# Altium footprint library Binh.PcbLib: 863 footprints (part 14 of 54)
Each footprint in its own frame and in the unit in brackets; x right, y up, seen from the top. Pads: shape width x height; smd on the part's side, far side on the other; paste and mask are expansions set on the pad; w line width, h text height; cw(c..) or ccw(c..) is an arc to the next point about the centre after c.
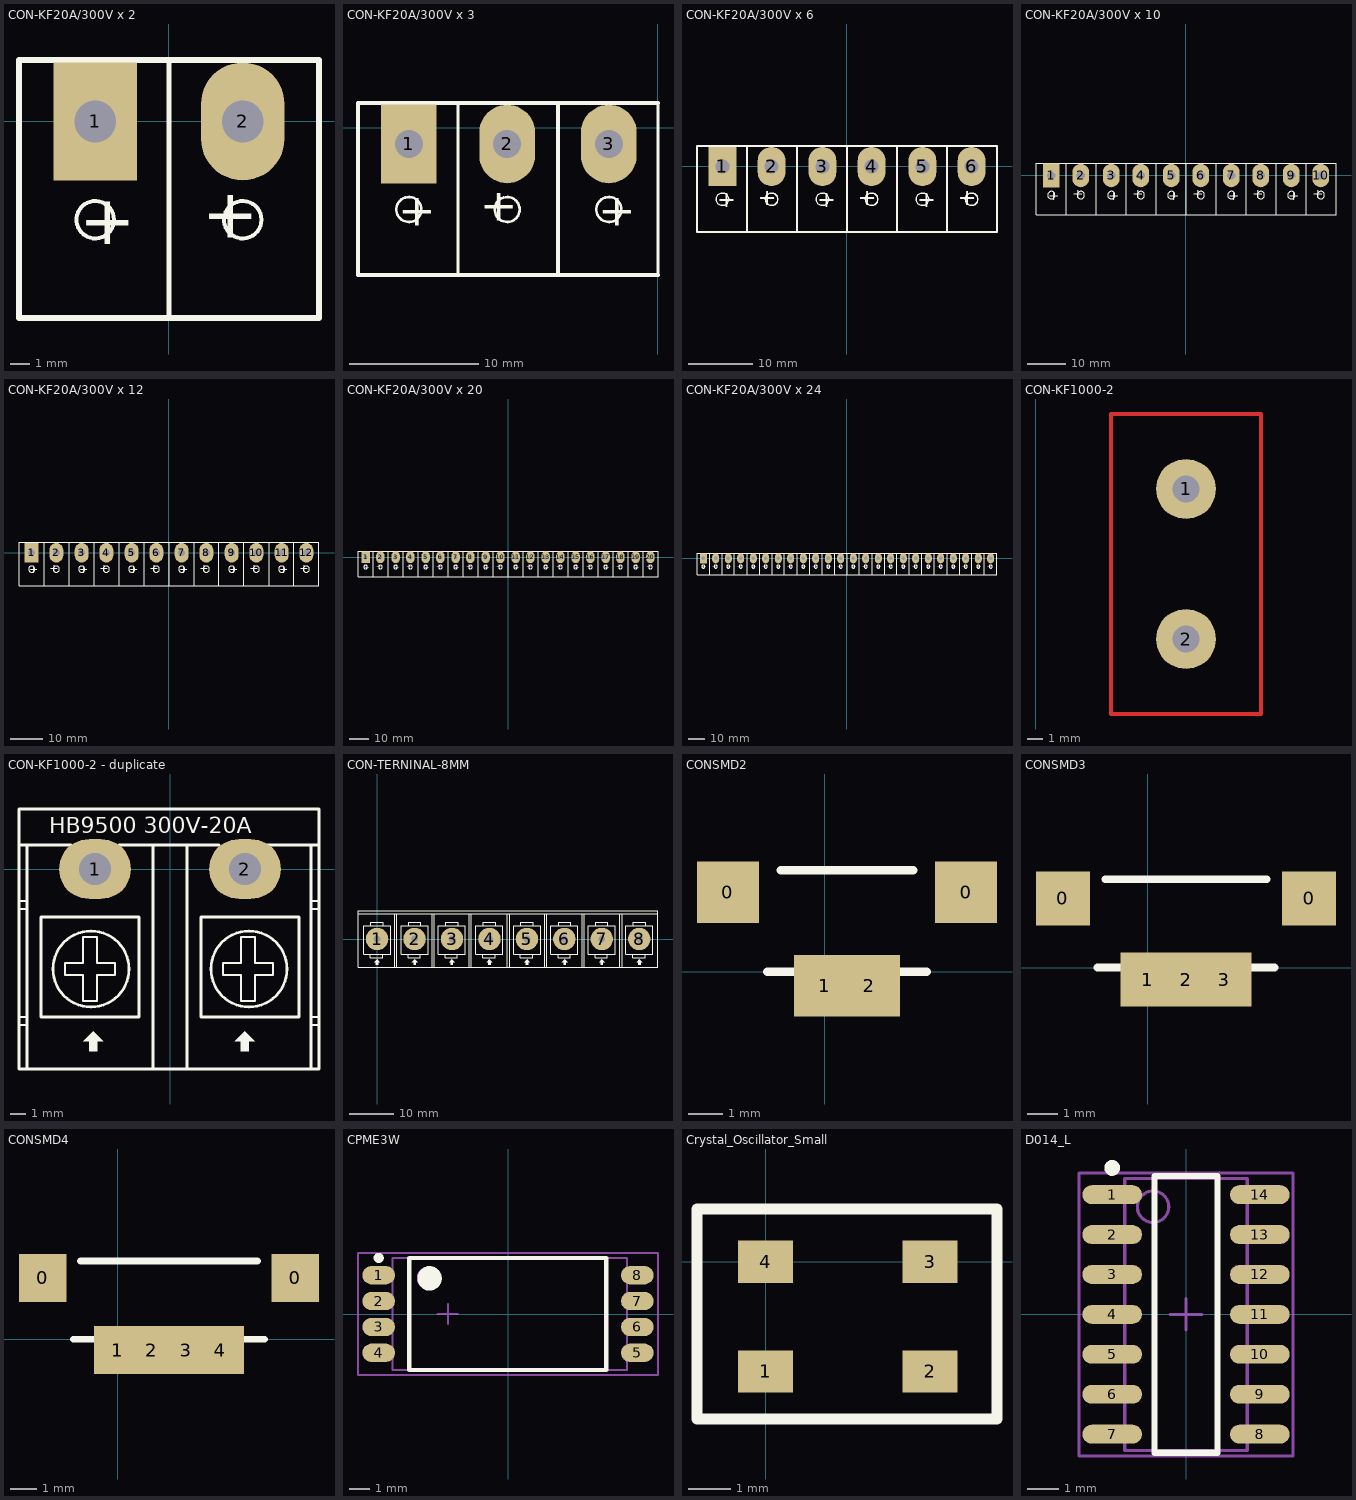
[diagram p13: the footprints below, top view; thin cyan lines are the x and y axes]

## CON-KF20A/300V x 2 [mil] "Jac nguon 220V 20A XANH"
pads (2):
  rect 170x240 hole 85: 1(-150,0)
  oval 170x240 hole 85: 2(150,0)
Top Overlay:
  circle w8: c-150,-200 r38.08
  circle w8: c150,-200 r38.08
  lines w10: 0,-400 0,125
  lines w11.81: 305.12,-400 305.12,125 ; 305.12,-400 305.12,125 ; 305.12,-400 -305.12,-400 -305.12,125 305.12,125
  text "+" at -183,-250 h100
  text "+" at 183,-150 h100

## CON-KF20A/300V x 3 [mil] "Jac nguon 220V 20A XANH"
height 500
pads (3):
  rect 170x240 hole 85: 1(-760.24,-50)
  oval 170x240 hole 85: 2(-460.24,-50) 3(-150,-50)
Top Overlay:
  circle w8: c-460.24,-250 r38.08
  circle w8: c-760.24,-250 r38.08
  circle w8: c-150,-250 r38.08
  lines w10: -610.24,-450 -610.24,75 ; 0,-450 0,75
  lines w11.81: 0,-450 -305.12,-450 ; 0,75 -915.35,75 -915.35,-450 -305.12,-450 ; -305.12,-450 -305.12,75 -305.12,-450
  text "+" at -427.24,-200 h100
  text "+" at -793.24,-300 h100
  text "+" at -183,-300 h100

## CON-KF20A/300V x 6 [mil] "Jac nguon 220V 20A XANH"
height 216.54
pads (6):
  rect 170x240 hole 85: 1(-760.24,0)
  oval 170x240 hole 85: 2(-460.24,0) 3(-150,0) 4(150,0) 5(460.24,0) 6(760.24,0)
Top Overlay:
  circle w8: c-460.24,-200 r38.08
  circle w8: c-760.24,-200 r38.08
  circle w8: c-150,-200 r38.08
  circle w8: c150,-200 r38.08
  circle w8: c760.24,-200 r38.08
  circle w8: c460.24,-200 r38.08
  lines w10: -610.24,-400 -610.24,125 ; 0,-400 0,125 ; 610.24,-400 610.24,125
  lines w11.81: -305.12,-400 -915.35,-400 -915.35,125 -305.12,125 ; -305.12,-400 -305.12,125 ; -305.12,-400 -305.12,125 ; -305.12,-400 305.12,-400 ; -305.12,125 305.12,125 ; 305.12,-400 305.12,125 ; 305.12,-400 915.35,-400 ; 305.12,-400 305.12,125 ; 305.12,125 915.35,125 ; 915.35,-400 915.35,125 ; 915.35,-400 915.35,125
  text "+" at -427.24,-150 h100
  text "+" at -793.24,-250 h100
  text "+" at -183,-250 h100
  text "+" at 183,-150 h100
  text "+" at 793.24,-150 h100
  text "+" at 427.24,-250 h100

## CON-KF20A/300V x 10 [mil] "Jac nguon 220V 20A XANH"
height 216.54
pads (10):
  rect 170x240 hole 85: 1(-1370.47,0)
  oval 170x240 hole 85: 2(-1070.47,0) 3(-760.24,0) 4(-460.24,0) 5(-150,0) 6(150,0) 7(460.24,0) 8(760.24,0) 9(1070.47,0) 10(1370.47,0)
Top Overlay:
  circle w8: c-1070.47,-200 r38.08
  circle w8: c-1370.47,-200 r38.08
  circle w8: c-760.24,-200 r38.08
  circle w8: c-460.24,-200 r38.08
  circle w8: c150,-200 r38.08
  circle w8: c-150,-200 r38.08
  circle w8: c760.24,-200 r38.08
  circle w8: c460.24,-200 r38.08
  circle w8: c1370.47,-200 r38.08
  circle w8: c1070.47,-200 r38.08
  lines w10: -1220.47,-400 -1220.47,125 ; -610.24,-400 -610.24,125 ; 0,-400 0,125 ; 610.24,-400 610.24,125 ; 1220.47,-400 1220.47,125
  lines w11.81: -915.35,-400 -1525.59,-400 -1525.59,125 -915.35,125 ; -915.35,-400 -915.35,125 ; -915.35,-400 -915.35,125 ; -915.35,-400 -305.12,-400 ; -915.35,125 -305.12,125 ; -305.12,-400 -305.12,125 ; -305.12,-400 305.12,-400 ; -305.12,-400 -305.12,125 ; -305.12,125 305.12,125 ; 305.12,-400 305.12,125 ; 305.12,-400 915.35,-400 ; 305.12,-400 305.12,125 ; 305.12,125 915.35,125 ; 915.35,-400 915.35,125 ; 915.35,-400 1525.59,-400 ; 915.35,-400 915.35,125 ; 915.35,125 1525.59,125 ; 1525.59,-400 1525.59,125 ; 1525.59,-400 1525.59,125
  text "+" at -1037.47,-150 h100
  text "+" at -1403.47,-250 h100
  text "+" at -793.24,-250 h100
  text "+" at -427.24,-150 h100
  text "+" at 183,-150 h100
  text "+" at -183,-250 h100
  text "+" at 793.24,-150 h100
  text "+" at 427.24,-250 h100
  text "+" at 1403.47,-150 h100
  text "+" at 1037.47,-250 h100

## CON-KF20A/300V x 12 [mil] "Jac nguon 220V 20A XANH"
height 216.54
pads (12):
  rect 170x240 hole 85: 1(-1675.59,0)
  oval 170x240 hole 85: 2(-1375.59,0) 3(-1065.35,0) 4(-765.35,0) 5(-455.12,0) 6(-155.12,0) 7(155.12,0) 8(455.12,0) 9(765.35,0) 10(1065.35,0) 11(1375.59,0) 12(1675.59,0)
Top Overlay:
  circle w8: c-1375.59,-200 r38.08
  circle w8: c-1675.59,-200 r38.08
  circle w8: c-1065.35,-200 r38.08
  circle w8: c-765.35,-200 r38.08
  circle w8: c-155.12,-200 r38.08
  circle w8: c-455.12,-200 r38.08
  circle w8: c455.12,-200 r38.08
  circle w8: c155.12,-200 r38.08
  circle w8: c1065.35,-200 r38.08
  circle w8: c765.35,-200 r38.08
  circle w8: c1675.59,-200 r38.08
  circle w8: c1375.59,-200 r38.08
  lines w10: -1525.59,-400 -1525.59,125 ; -915.35,-400 -915.35,125 ; -305.12,-400 -305.12,125 ; 305.12,-400 305.12,125 ; 915.35,-400 915.35,125 ; 1525.59,-400 1525.59,125
  lines w11.81: -1220.47,-400 -1830.71,-400 -1830.71,125 -1220.47,125 ; -1220.47,-400 -1220.47,125 ; -1220.47,-400 -1220.47,125 ; -1220.47,-400 -610.24,-400 ; -1220.47,125 -610.24,125 ; -610.24,-400 -610.24,125 ; -610.24,-400 0,-400 ; -610.24,-400 -610.24,125 ; -610.24,125 0,125 ; 0,-400 0,125 ; 0,-400 610.24,-400 ; 0,-400 0,125 ; 0,125 610.24,125 ; 610.24,-400 610.24,125 ; 610.24,-400 1220.47,-400 ; 610.24,-400 610.24,125 ; 610.24,125 1220.47,125 ; 1220.47,-400 1220.47,125 ; 1220.47,-400 1830.71,-400 ; 1220.47,-400 1220.47,125 ; 1220.47,125 1830.71,125 ; 1830.71,-400 1830.71,125 ; 1830.71,-400 1830.71,125
  text "+" at -1342.59,-150 h100
  text "+" at -1708.59,-250 h100
  text "+" at -1098.35,-250 h100
  text "+" at -732.35,-150 h100
  text "+" at -122.12,-150 h100
  text "+" at -488.12,-250 h100
  text "+" at 488.12,-150 h100
  text "+" at 122.12,-250 h100
  text "+" at 1098.35,-150 h100
  text "+" at 732.35,-250 h100
  text "+" at 1708.59,-150 h100
  text "+" at 1342.59,-250 h100

## CON-KF20A/300V x 20 [mil] "Jac nguon 220V 20A XANH"
height 216.54
pads (20):
  rect 170x240 hole 85: 1(-2896.06,0)
  oval 170x240 hole 85: 2(-2596.06,0) 3(-2285.83,0) 4(-1985.83,0) 5(-1675.59,0) 6(-1375.59,0) 7(-1065.35,0) 8(-765.35,0) 9(-455.12,0) 10(-155.12,0) 11(155.12,0) 12(455.12,0) 13(765.35,0) 14(1065.35,0) 15(1375.59,0) 16(1675.59,0) 17(1985.83,0) 18(2285.83,0) 19(2596.06,0) 20(2896.06,0)
Top Overlay:
  circle w8: c2596.06,-200 r38.08
  circle w8: c2896.06,-200 r38.08
  circle w8: c1985.83,-200 r38.08
  circle w8: c2285.83,-200 r38.08
  circle w8: c1375.59,-200 r38.08
  circle w8: c1675.59,-200 r38.08
  circle w8: c765.35,-200 r38.08
  circle w8: c1065.35,-200 r38.08
  circle w8: c155.12,-200 r38.08
  circle w8: c455.12,-200 r38.08
  circle w8: c-455.12,-200 r38.08
  circle w8: c-155.12,-200 r38.08
  circle w8: c-1065.35,-200 r38.08
  circle w8: c-765.35,-200 r38.08
  circle w8: c-1675.59,-200 r38.08
  circle w8: c-1375.59,-200 r38.08
  circle w8: c-1985.83,-200 r38.08
  circle w8: c-2285.83,-200 r38.08
  circle w8: c-2896.06,-200 r38.08
  circle w8: c-2596.06,-200 r38.08
  lines w10: -2746.06,-400 -2746.06,125 ; -2135.83,-400 -2135.83,125 ; -1525.59,-400 -1525.59,125 ; -915.35,-400 -915.35,125 ; -305.12,-400 -305.12,125 ; 305.12,-400 305.12,125 ; 915.35,-400 915.35,125 ; 1525.59,-400 1525.59,125 ; 2135.83,-400 2135.83,125 ; 2746.06,-400 2746.06,125
  lines w11.81: -2440.94,-400 -1830.71,-400 ; -2440.94,-400 -2440.94,125 ; -2440.94,-400 -2440.94,125 ; -2440.94,-400 -3051.18,-400 -3051.18,125 -2440.94,125 ; -2440.94,125 -1830.71,125 ; -1830.71,-400 -1830.71,125 ; -1830.71,-400 -1220.47,-400 ; -1830.71,-400 -1830.71,125 ; -1830.71,125 -1220.47,125 ; -1220.47,-400 -1220.47,125 ; -1220.47,-400 -610.24,-400 ; -1220.47,-400 -1220.47,125 ; -1220.47,125 -610.24,125 ; -610.24,-400 -610.24,125 ; -610.24,-400 0,-400 ; -610.24,-400 -610.24,125 ; -610.24,125 0,125 ; 0,-400 0,125 ; 0,-400 610.24,-400 ; 0,-400 0,125 ; 0,125 610.24,125 ; 610.24,-400 610.24,125 ; 610.24,-400 1220.47,-400 ; 610.24,-400 610.24,125 ; 610.24,125 1220.47,125 ; 1220.47,-400 1220.47,125 ; 1220.47,-400 1830.71,-400 ; 1220.47,-400 1220.47,125 ; 1220.47,125 1830.71,125 ; 1830.71,-400 1830.71,125 ; 1830.71,-400 2440.94,-400 ; 1830.71,-400 1830.71,125 ; 1830.71,125 2440.94,125 ; 2440.94,-400 2440.94,125 ; 2440.94,-400 3051.18,-400 3051.18,125 2440.94,125 ; 2440.94,-400 2440.94,125
  text "+" at 2563.06,-250 h100
  text "+" at 2929.06,-150 h100
  text "+" at 1952.83,-250 h100
  text "+" at 2318.83,-150 h100
  text "+" at 1342.59,-250 h100
  text "+" at 1708.59,-150 h100
  text "+" at 732.35,-250 h100
  text "+" at 1098.35,-150 h100
  text "+" at 122.12,-250 h100
  text "+" at 488.12,-150 h100
  text "+" at -488.12,-250 h100
  text "+" at -122.12,-150 h100
  text "+" at -1098.35,-250 h100
  text "+" at -732.35,-150 h100
  text "+" at -1708.59,-250 h100
  text "+" at -1342.59,-150 h100
  text "+" at -1952.83,-150 h100
  text "+" at -2318.83,-250 h100
  text "+" at -2929.06,-250 h100
  text "+" at -2563.06,-150 h100

## CON-KF20A/300V x 24 [mil] "Jac nguon 220V 20A"
pads (24):
  rect 170x240 hole 85: 1(-3506.3,0)
  oval 170x240 hole 85: 2(-3206.3,0) 3(-2896.06,0) 4(-2596.06,0) 5(-2285.83,0) 6(-1985.83,0) 7(-1675.59,0) 8(-1375.59,0) 9(-1065.35,0) 10(-765.35,0) 11(-455.12,0) 12(-155.12,0) 13(155.12,0) 14(455.12,0) 15(765.35,0) 16(1065.35,0) 17(1375.59,0) 18(1675.59,0) 19(1985.83,0) 20(2285.83,0) 21(2596.06,0) 22(2896.06,0) 23(3206.3,0) 24(3506.3,0)
Top Overlay:
  circle w8: c2596.06,-200 r38.08
  circle w8: c2896.06,-200 r38.08
  circle w8: c-3206.3,-200 r38.08
  circle w8: c-3506.3,-200 r38.08
  circle w8: c-2896.06,-200 r38.08
  circle w8: c-2596.06,-200 r38.08
  circle w8: c-1985.83,-200 r38.08
  circle w8: c-2285.83,-200 r38.08
  circle w8: c-1375.59,-200 r38.08
  circle w8: c-1675.59,-200 r38.08
  circle w8: c-765.35,-200 r38.08
  circle w8: c-1065.35,-200 r38.08
  circle w8: c-155.12,-200 r38.08
  circle w8: c-455.12,-200 r38.08
  circle w8: c455.12,-200 r38.08
  circle w8: c155.12,-200 r38.08
  circle w8: c1065.35,-200 r38.08
  circle w8: c765.35,-200 r38.08
  circle w8: c1675.59,-200 r38.08
  circle w8: c1375.59,-200 r38.08
  circle w8: c2285.83,-200 r38.08
  circle w8: c1985.83,-200 r38.08
  circle w8: c3506.3,-200 r38.08
  circle w8: c3206.3,-200 r38.08
  lines w10: -3356.3,-400 -3356.3,125 ; -2746.06,-400 -2746.06,125 ; -2135.83,-400 -2135.83,125 ; -1525.59,-400 -1525.59,125 ; -915.35,-400 -915.35,125 ; -305.12,-400 -305.12,125 ; 305.12,-400 305.12,125 ; 915.35,-400 915.35,125 ; 1525.59,-400 1525.59,125 ; 2135.83,-400 2135.83,125 ; 2746.06,-400 2746.06,125 ; 3356.3,-400 3356.3,125
  lines w11.81: -3051.18,-400 -3661.42,-400 -3661.42,125 -3051.18,125 ; -3051.18,-400 -3051.18,125 ; -3051.18,-400 -3051.18,125 ; -3051.18,-400 -2440.94,-400 ; -3051.18,125 -2440.94,125 ; -2440.94,-400 -2440.94,125 ; -2440.94,-400 -1830.71,-400 ; -2440.94,-400 -2440.94,125 ; -2440.94,125 -1830.71,125 ; -1830.71,-400 -1830.71,125 ; -1830.71,-400 -1220.47,-400 ; -1830.71,-400 -1830.71,125 ; -1830.71,125 -1220.47,125 ; -1220.47,-400 -1220.47,125 ; -1220.47,-400 -610.24,-400 ; -1220.47,-400 -1220.47,125 ; -1220.47,125 -610.24,125 ; -610.24,-400 -610.24,125 ; -610.24,-400 0,-400 ; -610.24,-400 -610.24,125 ; -610.24,125 0,125 ; 0,-400 0,125 ; 0,-400 610.24,-400 ; 0,-400 0,125 ; 0,125 610.24,125 ; 610.24,-400 610.24,125 ; 610.24,-400 1220.47,-400 ; 610.24,-400 610.24,125 ; 610.24,125 1220.47,125 ; 1220.47,-400 1220.47,125 ; 1220.47,-400 1830.71,-400 ; 1220.47,-400 1220.47,125 ; 1220.47,125 1830.71,125 ; 1830.71,-400 1830.71,125 ; 1830.71,-400 2440.94,-400 ; 1830.71,-400 1830.71,125 ; 1830.71,125 2440.94,125 ; 2440.94,-400 3051.18,-400 ; 2440.94,-400 2440.94,125 ; 2440.94,-400 2440.94,125 ; 2440.94,125 3051.18,125 ; 3051.18,-400 3051.18,125 ; 3051.18,-400 3051.18,125 ; 3051.18,-400 3661.42,-400 3661.42,125 3051.18,125
  text "+" at 2563.06,-250 h100
  text "+" at 2929.06,-150 h100
  text "+" at -3173.3,-150 h100
  text "+" at -3539.3,-250 h100
  text "+" at -2929.06,-250 h100
  text "+" at -2563.06,-150 h100
  text "+" at -1952.83,-150 h100
  text "+" at -2318.83,-250 h100
  text "+" at -1342.59,-150 h100
  text "+" at -1708.59,-250 h100
  text "+" at -732.35,-150 h100
  text "+" at -1098.35,-250 h100
  text "+" at -122.12,-150 h100
  text "+" at -488.12,-250 h100
  text "+" at 488.12,-150 h100
  text "+" at 122.12,-250 h100
  text "+" at 1098.35,-150 h100
  text "+" at 732.35,-250 h100
  text "+" at 1708.59,-150 h100
  text "+" at 1342.59,-250 h100
  text "+" at 2318.83,-150 h100
  text "+" at 1952.83,-250 h100
  text "+" at 3539.3,-150 h100
  text "+" at 3173.3,-250 h100

## CON-KF1000-2 [mm] "pin to pin 10mm"
pads (2):
  round 4 hole 1.8: 1(10,20) 2(10,10)
Top Layer:
  lines w0.254: 5,5 15,5 15,25 5,25 5,5

## CON-KF1000-2 - duplicate [mil] "Header 2: 300V-20A, 2 pin, hight 300mil, Pin to Pin 10mm Colour Green"
height 300
pads (2):
  oval 180x150 hole 80: 1(-187.5,0) 2(187.5,0)
Top Overlay:
  circle w7: c-197.5,-250 r95
  circle w7: c197.5,-250 r95
  region: -192.5,-405 -217.5,-430 -202.5,-430 -202.5,-455 -182.5,-455 -182.5,-430 -167.5,-430
  region: 187.5,-405 162.5,-430 177.5,-430 177.5,-455 197.5,-455 197.5,-430 212.5,-430
  lines w5: -375,-390 -360,-390 ; -375,-370 -360,-370 ; -375,-100 -360,-100 ; -375,-80 -360,-80 ; 355,-390 370,-390 ; 355,-370 370,-370 ; 355,-100 370,-100 ; 355,-80 370,-80 ; -262.5,-265 -262.5,-235 -217.5,-235 -217.5,-170 -182.5,-170 -182.5,-235 -137.5,-235 -137.5,-265 -182.5,-265 -182.5,-330 -217.5,-330 -217.5,-265 -262.5,-265 ; 132.5,-265 177.5,-265 177.5,-330 212.5,-330 212.5,-265 257.5,-265 257.5,-235 212.5,-235 212.5,-170 177.5,-170 177.5,-235 132.5,-235 132.5,-265
  lines w7: -377.5,60 -247.5,60 ; -357.5,-495 -357.5,60 ; -127.5,60 122.5,60 ; -42.5,-495 -42.5,60 ; 42.5,-495 42.5,60 ; 242.5,60 372.5,60 ; 352.5,-495 352.5,60 ; -377.5,-500 -377.5,150 372.5,150 372.5,-500 -377.5,-500 ; -322.5,-370 -77.5,-370 -77.5,-120 -322.5,-120 -322.5,-370 ; 77.5,-370 77.5,-120 322.5,-120 322.5,-370 77.5,-370
  text "HB9500 300V-20A" at -302.5,90 h40

## CON-TERNINAL-8MM [mil] "Header 6"
height 300
pads (8):
  round 200 hole 60: 1(0,0) 2(333.33,0) 3(666.67,0) 4(1000,0) 5(1333.33,0) 6(1666.67,0) 7(2000,0) 8(2333.33,0)
Top Overlay:
  drawing of 107 lines, arcs and shapes, not listed

## CONSMD2 [mil]
pads (4):
  rect 70x70 smd: 0(-110,90) 0(160,90) 1(0,-15.75) 2(50,-15.75)
Top Overlay:
  lines w10: -65,0 -30,0 ; -50,115 100,115 ; 80,0 115,0

## CONSMD3 [mil]
pads (5):
  rect 70x70 smd: 0(-110,90) 0(210,90) 1(0,-15.75) 2(50,-15.75) 3(100,-15.75)
Top Overlay:
  lines w10: -65,0 -30,0 ; -55,115 155,115 ; 130,0 165,0

## CONSMD4 [mil]
pads (6):
  rect 70x70 smd: 0(-110,90) 0(260,90) 1(0,-15.75) 2(50,-15.75) 3(100,-15.75) 4(150,-15.75)
Top Overlay:
  lines w10: -65,0 -30,0 ; -55,115 205,115 ; 180,0 215,0

## CPME3W [mm] "SOP, 8-Leads, Body 5.3x5.3mm, Pitch 1.27mm, IPC Medium Density"
height 1.5
pads (8):
  oval 1.6x0.9 smd: 1(-6.35,1.905) 2(-6.35,0.635) 3(-6.35,-0.635) 4(-6.35,-1.905) 5(6.35,-1.905) 6(6.35,-0.635) 7(6.35,0.635) 8(6.35,1.905)
Top Overlay:
  circle w0.6: c-3.85,1.75 r0.3
  circle w0.25: c-6.35,2.755 r0.125
  lines w0.2: -4.85,-2.75 4.826,-2.75 4.826,2.75 -4.85,2.75 -4.85,-2.75
Mechanical 13:
  circle w0.1: c-3.929,1.778 r0.5
  lines w0.1: -5.675,-2.75 5.842,-2.75 5.842,2.75 -5.675,2.75 -5.675,-2.75
Mechanical 15:
  lines w0.1: -3.45,0 -2.45,0 ; -2.95,-0.5 -2.95,0.5 ; -7.366,-3 7.366,-3 7.366,3 -7.366,3 -7.366,-3

## Crystal_Oscillator_Small [mm]
pads (4):
  rect 1.3x1 smd: 1(0,-2.6) 2(3.9,-2.6) 3(3.9,0) 4(0,0)
Top Overlay:
  lines w0.254: -1.623,-3.73 5.484,-3.73 5.484,1.25 -1.623,1.25 -1.623,-3.73

## D014_L [mm] "SOIC, 14-Leads, Body 8.7x3.9mm, Pitch 1.27mm, IPC High Density"
height 1.75
pads (14):
  oval 1.9x0.6 smd: 1(-2.35,3.81) 2(-2.35,2.54) 3(-2.35,1.27) 4(-2.35,0) 5(-2.35,-1.27) 6(-2.35,-2.54) 7(-2.35,-3.81) 8(2.35,-3.81) 9(2.35,-2.54) 10(2.35,-1.27) 11(2.35,0) 12(2.35,1.27) 13(2.35,2.54) 14(2.35,3.81)
Top Overlay:
  circle w0.25: c-2.35,4.66 r0.125
  lines w0.2: -1,-4.4 -1,4.4 1,4.4 1,-4.4 -1,-4.4
Mechanical 13:
  circle w0.1: c-1.05,3.425 r0.5
  lines w0.1: -1.95,-4.325 -1.95,4.325 1.95,4.325 1.95,-4.325 -1.95,-4.325
Mechanical 15:
  lines w0.1: -0.5,0 0.5,0 ; 0,-0.5 0,0.5 ; -3.4,-4.5 -3.4,4.5 3.4,4.5 3.4,-4.5 -3.4,-4.5
3D body: height 1.75, standoff 0, extent -1.95,-4.325 1.95,4.325